# Altium footprint library chipfc_extras_footprint.PCBLIB: 89 footprints (part 3 of 6)
Each footprint in its own frame and in the unit in brackets; x right, y up, seen from the top. Pads: shape width x height; smd on the part's side, far side on the other; paste and mask are expansions set on the pad; w line width, h text height; cw(c..) or ccw(c..) is an arc to the next point about the centre after c.
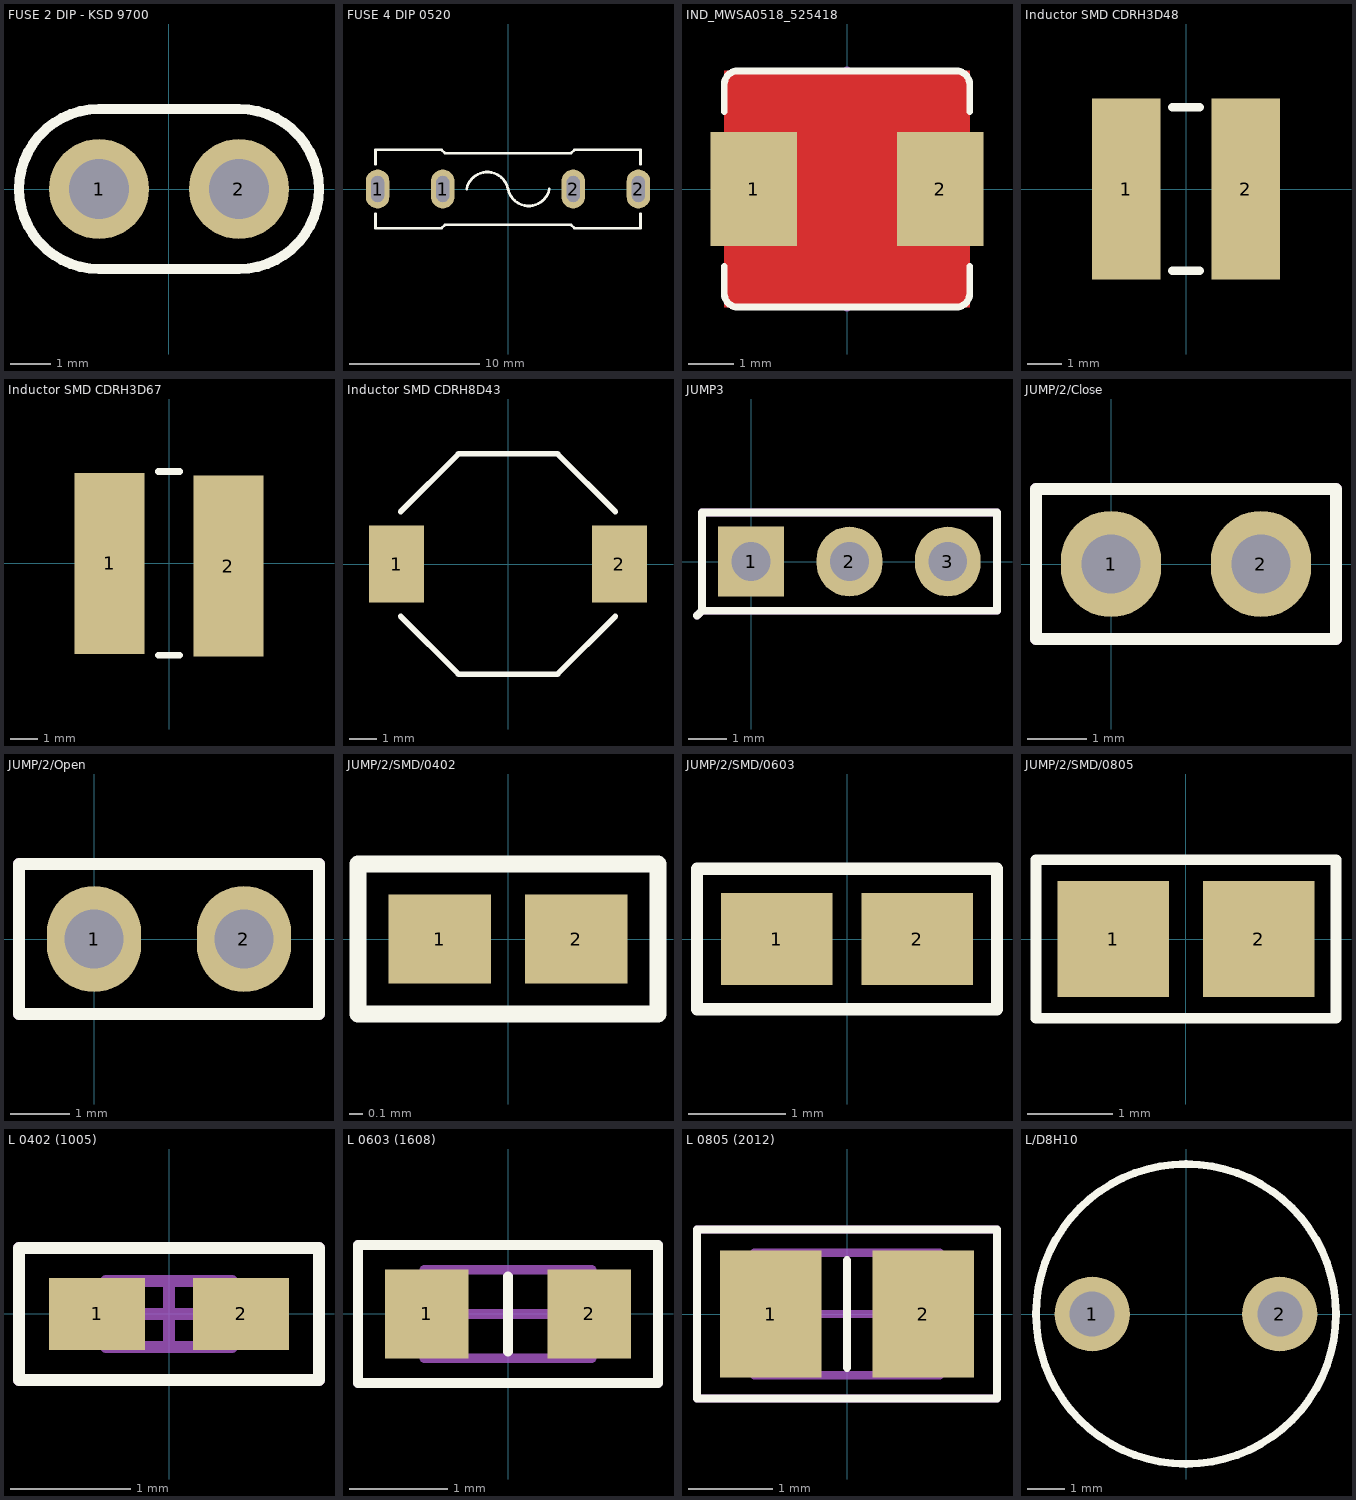
[diagram p2: the footprints below, top view; thin cyan lines are the x and y axes]

## FUSE 2 DIP - KSD 9700 [mm]
pads (2):
  round 2.5 hole 1.5: 1(-1.75,0) 2(1.75,0)
Top Overlay:
  lines w0.254: -1.75,-2 cw(c-1.75,0) -1.75,2 1.75,2 cw(c1.75,0) 1.75,-2 -1.75,-2

## FUSE 4 DIP 0520 [mm] "5mm x 20mm"
pads (4):
  oval 1.8x3 hole 1 slot 2 at 90 deg: 1(-10,0) 1(-5,0) 2(5,0) 2(10,0)
Top Overlay:
  lines w0.203: -10.16,-1.905 -10.16,-3 -5.08,-3 -4.83,-2.75 4.83,-2.75 5.08,-3 10.16,-3 10.16,-1.905 ; -10.16,1.905 -10.16,3 -5.08,3 -4.83,2.75 4.83,2.75 5.08,3 10.16,3 10.16,1.905 ; -3.175,0 cw(c-1.587,-0.318) 0,0 ccw(c1.587,0.318) 3.175,0
3D body "User Library-Fuse Small 1A.step": height 8.9, standoff 3.8, extent -9.85,-2.56 9.85,2.54
3D body "User Library-Fuse Leg_2009.step": height 9.6, standoff -3.3, extent 4.445,-3.095 10.541,3.095
3D body "User Library-Fuse Leg_2009.step": height 9.6, standoff -3.3, extent -10.541,-3.095 -4.445,3.095

## IND_MWSA0518_525418 [mm]
pads (2):
  rect 1.9x2.5 smd paste+0 mask+0: 1(-2.05,0) 2(2.05,0)
Top Layer:
  pour cut-out: -2.7,2.6 2.7,2.6 2.7,-2.6 -2.7,-2.6
Top Overlay:
  lines w0.152: -2.7,-1.7 -2.7,-2.3 ccw(c-2.4,-2.3) -2.4,-2.6 2.4,-2.6 ccw(c2.4,-2.3) 2.7,-2.3 2.7,-1.7 ; -2.7,1.7 -2.7,2.3 cw(c-2.4,2.3) -2.4,2.6 2.4,2.6 cw(c2.4,2.3) 2.7,2.3 2.7,1.7
Mechanical 1:
  lines w0.2: -2.7,0 0,0 ; 0,-2.6 0,0 ; 0,2.6 0,0 ; 2.7,0 0,0
3D body: height 1.8, standoff 0, extent -2.7,-2.6 2.7,2.6

## Inductor SMD CDRH3D48 [mm] "Precision Wire Wound Inductor, 2-Leads, Body 10.0x8.0mm, IPC Low Density"
height 4.5
pads (2):
  rect 2x5.3 smd: 1(-1.75,0) 2(1.75,0)
Top Overlay:
  lines w0.254: -0.4,-2.4 0.4,-2.4 ; -0.4,2.4 0.4,2.4
3D body "User Library-SDR0403.STEP": height 3.5, standoff 0, extent -2.25,-2.241 2.25,2.25

## Inductor SMD CDRH3D67 [mm] "Precision Wire Wound Inductor, 2-Leads, Body 10.0x8.0mm, IPC Low Density"
height 4.5
pads (2):
  rect 2.6x6.7 smd: 1(-2.2,0) 2(2.2,-0.1)
Top Overlay:
  lines w0.254: -0.4,-3.4 0.4,-3.4 ; -0.4,3.4 0.4,3.4
3D body "SUMIDA-CDRH6D28.step": height 2.9, standoff 0, extent -3.35,-3.35 3.35,3.35

## Inductor SMD CDRH8D43 [mm] "Precision Wire Wound Inductor, 2-Leads, Body 10.0x8.0mm, IPC Low Density"
height 4.5
pads (2):
  rect 2x2.8 smd: 1(-4.05,0) 2(4.05,0)
Top Overlay:
  lines w0.203: -3.9,-1.9 -1.8,-4 1.8,-4 3.9,-1.9 ; -3.9,1.9 -1.8,4 1.8,4 3.9,1.9
3D body "User Library-6mm radial ceramic disc capacitor.step": height 4.35, standoff 0, extent -5.657,-5.657 5.657,5.657

## JUMP3 [mm]
pads (3):
  rect 1.7x1.8 hole 1: 1(0,0)
  oval 1.7x1.8 hole 1: 2(2.54,0) 3(5.08,0)
Top Overlay:
  lines w0.203: -1.397,-1.397 -1.27,-1.27 ; -1.27,-1.27 -1.27,1.27 6.35,1.27 6.35,-1.27 -1.27,-1.27
Mechanical 1:
  lines w0.203: -1.397,-1.397 -1.27,-1.27 ; -1.27,-1.27 -1.27,1.27 6.35,1.27 6.35,-1.27 -1.27,-1.27
3D body "Samtec Header 3pin 2.54mm.STEP": height 8.89, standoff -2.03, extent -1.27,-1.27 6.35,1.27
3D body "User Library-SHORTING JUMPER.step": height 8.54, standoff 2.64, extent -1.27,-1.27 3.81,1.27

## JUMP/2/Close [mm]
pads (2):
  oval 1.7x1.8 hole 1: 1(0,0) 2(2.54,0)
Top Overlay:
  lines w0.203: -1.27,-1.27 -1.27,1.27 3.81,1.27 3.81,-1.27 -1.27,-1.27
Mechanical 1:
  lines w0.203: -1.27,-1.27 -1.27,1.27 3.81,1.27 3.81,-1.27 -1.27,-1.27
3D body "Samtec Header 2pin 2.54mm.STEP": height 8.89, standoff -2.03, extent -1.27,-1.27 3.81,1.27
3D body "User Library-SHORTING JUMPER.step": height 8.54, standoff 2.64, extent -1.27,-1.27 3.81,1.27

## JUMP/2/Open [mm]
pads (2):
  oval 1.6x1.8 hole 1: 1(0,0) 2(2.54,0)
Top Overlay:
  lines w0.203: -1.27,-1.27 3.81,-1.27 3.81,1.27 -1.27,1.27 -1.27,-1.27
Mechanical 1:
  lines w0.203: -1.27,-1.27 3.81,-1.27 3.81,1.27 -1.27,1.27 -1.27,-1.27
3D body "Samtec Header 2pin 2.54mm.STEP": height 8.89, standoff -2.03, extent -1.27,-1.27 3.81,1.27

## JUMP/2/SMD/0402 [mm]
pads (2):
  rect 0.75x0.65 smd: 1(-0.5,0) 2(0.5,0)
Top Overlay:
  lines w0.127: -1.1,-0.55 -1.1,0.55 1.1,0.55 1.1,-0.55 -1.1,-0.55

## JUMP/2/SMD/0603 [mm] "Chip Resistor, 2-Leads, Body 1.6x0.8mm, IPC Medium Density"
height 0.55
pads (2):
  rect 1.15x0.95 smd: 1(-0.725,0) 2(0.725,0)
Top Overlay:
  lines w0.127: -1.55,-0.725 -1.55,0.725 1.55,0.725 1.55,-0.725 -1.55,-0.725

## JUMP/2/SMD/0805 [mm] "Chip Resistor, 2-Leads, Body 2.0x1.3mm, IPC Medium Density"
height 0.5
pads (2):
  rect 1.3x1.35 smd: 1(-0.85,0) 2(0.85,0)
Top Overlay:
  lines w0.127: -1.75,-0.925 -1.75,0.925 1.75,0.925 1.75,-0.925 -1.75,-0.925

## L 0402 (1005) [mm] "Chip Capacitor, 2-Leads, Body 1.0x0.5mm, IPC Medium Density"
height 0.55
pads (2):
  rect 0.8x0.6 smd: 1(-0.6,0) 2(0.6,0)
Top Overlay:
  lines w0.1: -1.25,-0.55 1.25,-0.55 1.25,0.55 -1.25,0.55 -1.25,-0.55
Mechanical 13:
  lines w0.1: -0.525,-0.275 0.525,-0.275 0.525,0.275 -0.525,0.275 -0.525,-0.275
Mechanical 15:
  lines w0.1: -0.275,0 0.275,0 ; 0,-0.275 0,0.275 ; -1.25,-0.55 1.25,-0.55 1.25,0.55 -1.25,0.55 -1.25,-0.55
3D body "User Library-Chip Inductor-L0402 (1005).step": height 0.5, standoff 0, extent -0.5,-0.3 0.5,0.3

## L 0603 (1608) [mm] "Chip Capacitor, 2-Leads, Body 1.6x0.8mm, IPC Medium Density"
height 0.8
pads (2):
  rect 0.85x0.9 smd: 1(-0.825,0) 2(0.825,0)
Top Overlay:
  lines w0.1: 0,-0.381 0,0.381 ; -1.525,-0.7 -1.525,0.7 1.525,0.7 1.525,-0.7 -1.525,-0.7
Mechanical 13:
  lines w0.1: -0.85,-0.45 -0.85,0.45 0.85,0.45 0.85,-0.45 -0.85,-0.45
Mechanical 15:
  lines w0.1: -0.45,0 0.45,0 ; 0,-0.45 0,0.45 ; -1.525,-0.7 -1.525,0.7 1.525,0.7 1.525,-0.7 -1.525,-0.7
3D body "User Library-Chip Inductor-L0603 (1608).step": height 0.8, standoff 0, extent -0.8,-0.475 0.8,0.475

## L 0805 (2012) [mm] "Chip Capacitor, 2-Leads, Body 2.0x1.3mm, IPC Medium Density"
height 0.85
pads (2):
  rect 1.2x1.5 smd: 1(-0.9,0) 2(0.9,0)
Top Overlay:
  lines w0.1: 0,-0.635 0,0.635 ; -1.775,-1 -1.775,1 1.775,1 1.775,-1 -1.775,-1
Mechanical 13:
  lines w0.1: -1.1,-0.725 -1.1,0.725 1.1,0.725 1.1,-0.725 -1.1,-0.725
Mechanical 15:
  lines w0.1: -0.5,0 0.5,0 ; 0,-0.5 0,0.5 ; -1.775,-1 1.775,-1 1.775,1 -1.775,1 -1.775,-1
3D body "User Library-Chip Inductor-L0805 (2012).step": height 0.95, standoff 0, extent -1,-0.6 1,0.6

## L/D8H10 [mm] "inductor Dia (7.80mm) Heigh (10.00mm)"
pads (2):
  round 2 hole 1.2: 1(-2.5,0) 2(2.5,0)
Top Overlay:
  circle w0.203: c0,0 r4
3D body "STEP-WE-TI-HV-8095-rev1.stp": height 9.5, standoff -5, extent -5.515,-5.516 5.516,5.515